# Altium schematic symbol library LATTICEPLDS_Library.SchLib: 291 symbols (part 12 of 32) (continued)
## LFE3-17EA-MG328
designator U?
SWAP_INFO: (S1+S2+S3+S4+S5+S6+S7+S8+S9+S10); SPLIT_INST: TRUE
part A pins: A3 PT4A||VREF1_0 TDQ7 (io), A4 PT7A TDQS7_P (io), A5 PT10A TDQ7 (io), A6 PT20A TDQ25 (io), A7 PT20B TDQ25 (io), A8 PT25A TDQS25_P (io), A9 PT25B TDQS25_N (io), B3 PT4B||VREF2_0 TDQ7 (io), B4 PT7B TDQS7_N (io), B5 PT10B TDQ7 (io), B6 PT13B TDQ16 (io), B7 PT22B TDQ25 (io), B8 PT23B TDQ25 (io), B9 PT28A||PCLKT0_0 TDQ25 (io), B10 PT28B||PCLKC0_0 TDQ25 (io), C6 PT13A TDQ16 (io), C7 PT22A TDQ25 (io), C8 PT23A TDQ25 (io), C9 PT26A TDQ25 (io), C10 PT26B TDQ25 (io), E7 VCCIO0 (power), E9 VCCIO0 (power), F8 VCCIO0 (power)
part B pins: A11 PT35A TDQ34 (io), A12 PT35B TDQ34 (io), A13 PT46A||VREF1_1 TDQ43 (io), A14 PT46B||VREF2_1 TDQ43 (io), B11 PT31A||PCLKT1_0 TDQ34 (io), B12 PT38A TDQ43 (io), B13 PT43A TDQS43_P (io), C11 PT31B||PCLKC1_0 TDQ34 (io), C12 PT38B TDQ43 (io), C13 PT43B TDQS43_N (io), E11 VCCIO1 (power), E13 VCCIO1 (power), F12 VCCIO1 (power)
part C pins: H14 VTT2 (power), J13 VCCIO2 (power), K14 VCCIO2 (power), K17 RUM0_VCCPLL (power), K18 PR18A||VREF1_2 RDQ23 (io), L18 PR20A*||RUM0_GDLLT_IN_A RDQ23 (io), L19 PR18B||VREF2_2 RDQ23 (io), M17 PR20B*||RUM0_GDLLT_IN_B RDQ23 (io), M18 PR26A*||PCLKT2_0 RDQ23 (io), M19 PR24B RDQ23 (io), N17 PR26B*||PCLKC2_0 RDQ23 (io), N18 PR26E_C||RUM0_GPLLT_IN_A (in), N19 PR26E_D||RUM0_GPLLT_IN_B (in)
part D pins: L14 VTT3 (power), M13 VTT3 (power), M14 VCCIO3 (power), N13 VCCIO3 (power), P14 VCCIO3 (power), P17 PR29A*||PCLKT3_0 RDQ32 (io), P19 PR29B*||PCLKC3_0 RDQ32 (io), R17 PR32B RDQS32_N (io), R18 PR32A RDQS32_P (io), R19 PR41A RDQS41_P (io), T17 PR35A*||VREF1_3 RDQ32 (io), T18 PR35B*||VREF2_3 RDQ32 (io), T19 PR41B RDQS41_N (io), U18 PR44A* RDQ41 (io), U19 PR44B* RDQ41 (io), V18 PR53A* RDQ50 (io), V19 PR53B* RDQ50 (io)
part E pins: K6 VCCIO6 (power), L6 VTT6 (power), L7 VCCIO6 (power), M7 VTT6 (power), N6 VCCIO6 (power), P6 VTT6 (power), R1 PL35A*||VREF1_6 LDQ32 (io), R2 PL29A*||PCLKT6_0 LDQ32 (io), R3 PL29B*||PCLKC6_0 LDQ32 (io), T1 PL35B*||VREF2_6 LDQ32 (io), T2 PL32B LDQS32_N (io), T3 PL32A LDQS32_P (io), U1 PL47A* LDQ50 (io), U2 PL33B LDQ32 (io), V1 PL53A* LDQ50 (io), V2 PL47B* LDQ50 (io), W2 PL53B* LDQ50 (io)
part F pins: C2 PL6A (io), D1 PL6B (io), D2 PL9B LDQ14 (io), D3 PL11A* LDQ14 (io), E1 PL9A LDQ14 (io), E2 PL12A* LDQ14 (io), E3 PL11B* LDQ14 (io), E6 VCCIO7 (power), F1 PL14A LDQS14_P (io), F3 PL12B* LDQ14 (io), G1 PL14B LDQS14_N (io), G2 PL15A LDQ14 (io), G3 PL15B LDQ14 (io), G7 VCCIO7 (power), H1 PL17A*||VREF1_7 LDQ14 (io), H2 PL17B*||VREF2_7 LDQ14 (io), H3 PL18A LDQ23 (io), H7 VTT7 (power), J1 PL20B*||LUM0_GDLLT_IN_B LDQ23 (io), J2 PL18B LDQ23 (io), J3 PL20A*||LUM0_GDLLT_IN_A LDQ23 (io), J6 VCCIO7 (power), K2 PL21A*||LUM0_GDLLT_FB_A LDQ23 (io), K3 LUM0_VCCPLL (power), L1 PL23B LDQS23_N (io), L2 PL21B*||LUM0_GDLLT_FB_B LDQ23 (io), L3 PL23A LDQS23_P (io), M1 PL24B LDQ23 (io), M2 PL24A LDQ23 (io), M3 PL26A*||PCLKT7_0 LDQ23 (io), N1 PL26E_A||LUM0_GPLLT_FB_A (in), N2 PL26E_C||LUM0_GPLLT_IN_A (in), N3 PL26B*||PCLKC7_0 LDQ23 (io), P1 PL26E_B||LUM0_GPLLT_FB_B (in), P3 PL26E_D||LUM0_GPLLT_IN_B (in)
part G pins: A2 TMS (in), A15 PT52B (io), A16 PT55A (io), A17 PT55B (io), A18 CFG2 (in), B1 TDO (out), B2 TCK (in), B14 PT52A (io), B15 PT50B (io), B16 PT53A (io), B17 PT53B (io), B18 CFG0 (in), B19 CFG1 (in), C1 TDI (in), C14 PT50A (io), C18 INITN (io), C19 PROGRAMN (in), D4 VCCJ (power), D17 PR6B||DI/CSSPI0N/CSSPIN (io), D18 PR6A (io), D19 CCLK (io), E17 PR8A||CS1N/HOLDN/CONT2N (io), E18 PR8B||CSN/SN/CONT1N (io), E19 DONE (io), F14 VCCIO8 (power), F17 PR11A||WRITEN (io), F19 PR9A||DOUT/CSON/CSSPI1N (io), G13 VCCIO8 (power), G17 PR14A||D3/SI (io), G18 PR11B||D0/SPIFASTN (io), G19 PR9B||MCLK (io), H17 PR14B||D4/SO (io), H18 PR12B||D2 (io), H19 PR12A||D1 (io), J17 PR15A||D5 (io), J18 PR15B||D6/SPID1 (io), J19 PR17A||D7/SPID0 (io), L17 PR17B||BUSY/SISPI (io), W18 XRES (in)
part H pins: T10 PCSA_REFCLKN (in), U10 PCSA_REFCLKP (in), V6 PCSA_VCCIB3 (power), V7 PCSA_VCCOB3 (power), V8 PCSA_VCCOB2 (power), V9 PCSA_VCCIB2 (power), V12 PCSA_VCCIB1 (power), V13 PCSA_VCCOB1 (power), V14 PCSA_VCCOB0 (power), V15 PCSA_VCCIB0 (power), W5 PCSA_HDINP3 (in), W6 PCSA_HDINN3 (in), W8 PCSA_HDOUTP3 (out), W9 PCSA_HDOUTN3 (out), W11 PCSA_HDOUTN0 (out), W12 PCSA_HDOUTP0 (out), W14 PCSA_HDINN0 (in), W15 PCSA_HDINP0 (in)
part I pins: A1 GND (power), A10 GND (power), A19 GND (power), C3 GND (power), C4 GND (power), C16 GND (power), C17 GND (power), D16 GND (power), E4 GND (power), E10 GND (power), E12 GND (power), E16 GND (power), F2 GND (power), F4 GND (power), F6 GND (power), F9 GND (power), F11 GND (power), F13 GND (power), F16 GND (power), F18 GND (power), G4 GND (power), G8 GND (power), G9 GND (power), G11 GND (power), G12 GND (power), G16 GND (power), H4 GND (power), H6 GND (power), H8 GND (power), H10 GND (power), H12 GND (power), H13 GND (power), H16 GND (power), J4 GND (power), J7 GND (power), J9 GND (power), J11 GND (power), J16 GND (power), K1 GND (power), K4 GND (power), K8 GND (power), K10 GND (power), K12 GND (power), K13 GND (power), K16 GND (power), K19 GND (power), L4 GND (power), L8 GND (power), L9 GND (power), L11 GND (power), L12 GND (power), L13 GND (power), L16 GND (power), M4 GND (power), M8 GND (power), M9 GND (power), M10 GND (power), M11 GND (power), M12 GND (power), M16 GND (power), N4 GND (power), N7 GND (power), N8 GND (power), N12 GND (power), N16 GND (power), P2 GND (power), P4 GND (power), P7 GND (power), P8 GND (power), P12 GND (power), P13 GND (power), P16 GND (power), P18 GND (power), R4 GND (power), R6 GND (power), R7 GND (power), R8 GND (power), R9 GND (power), R10 GND (power), R11 GND (power), R12 GND (power), R13 GND (power), R14 GND (power), R16 GND (power), T4 GND (power), T5 GND (power), T6 GND (power), T7 GND (power), T8 GND (power), T9 GND (power), T11 GND (power), T12 GND (power), T13 GND (power), T14 GND (power), T15 GND (power), T16 GND (power), U3 GND (power), U4 GND (power), U5 GND (power), U6 GND (power), U7 GND (power), U8 GND (power), U9 GND (power), U11 GND (power), U12 GND (power), U13 GND (power), U14 GND (power), U15 GND (power), U16 GND (power), U17 GND (power), V3 GND (power), V4 GND (power), V5 GND (power), V10 GND (power), V11 GND (power), V16 GND (power), V17 GND (power), W1 GND (power), W3 GND (power), W4 GND (power), W7 GND (power), W10 GND (power), W13 GND (power), W16 GND (power), W17 GND (power), W19 GND (power)
part J pins: C5 VCCAUX (power), C15 VCCAUX (power), E8 VCC (power), E14 VCC (power), F7 VCC (power), F10 VCCAUX (power), G6 VCC (power), G10 VCC (power), G14 VCC (power), H9 VCC (power), H11 VCC (power), J8 VCC (power), J10 VCC (power), J12 VCC (power), J14 VCCAUX (power), K7 VCCAUX (power), K9 VCC (power), K11 VCC (power), L10 VCC (power), M6 VCC (power), N9 VCCA (power), N10 VCCA (power), N11 VCCA (power), N14 VCC (power), P9 VCCA (power), P10 VCCA (power), P11 VCCA (power)
part C text: *=TrueLVDS
part D text: *=TrueLVDS
part E text: *=TrueLVDS
part F text: *=TrueLVDS

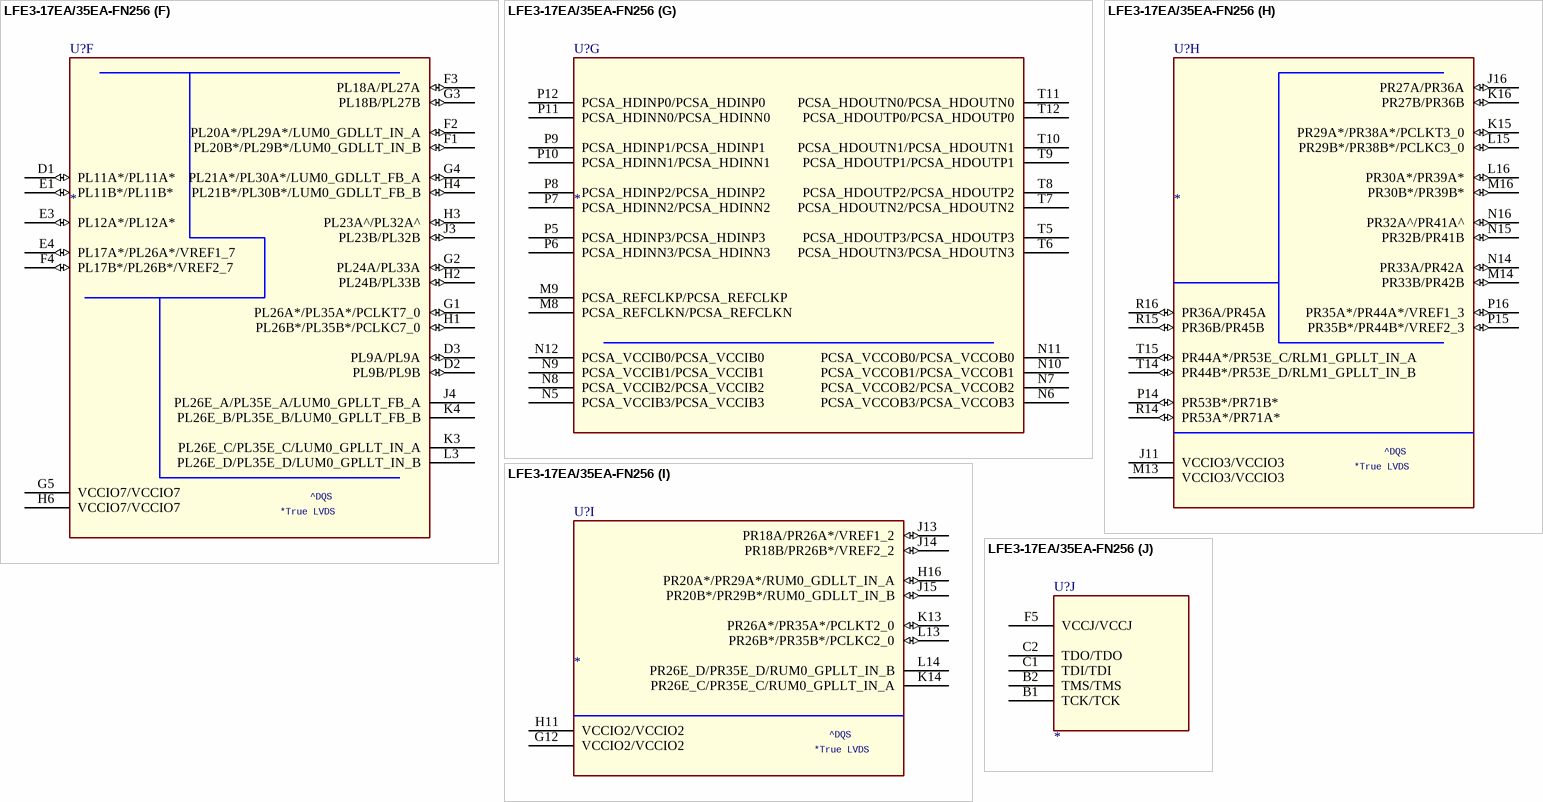
[diagram p127: symbol LFE3-17EA/35EA-FN256]

## LFE3-17EA/35EA-FN256
designator U?
SPLIT_INST: TRUE; SWAP_INFO: (S1+S2+S3+S4+S5+S6+S7+S8+S9+S10)
part A pins: J1 PL27A/PL36A (io), J6 VCCIO6/VCCIO6 (power), K1 PL29A*/PL38A*/PCLKT6_0 (io), K2 PL27B/PL36B (io), L1 PL29B*/PL38B*/PCLKC6_0 (io), L2 PL30A*/PL39A* (io), L4 PL32A^/PL41A^ (io), L5 PL32B/PL41B (io), M1 PL33A/PL42A (io), M2 PL30B*/PL39B* (io), M3 PL35A*/PL44A*/VREF1_6 (io), M4 VCCIO6/VCCIO6 (power), N1 PL33B/PL42B (io), N3 PL35B*/PL44B*/VREF2_6 (io), P1 PL36A/PL45A (io), P2 PL44A*/PL53E_C/LLM1_GPLLT_IN_A (io), P3 PL44B*/PL53E_D/LLM1_GPLLT_IN_B (io), R1 PL36B/PL45B (io), R2 PL53A*/PL71A* (io), R3 PL53B*/PL71B* (io), T2 PL51A/PL69A (io), T3 PL51B/PL69B (io)
part B pins: A2 PT5A/PT5A (io), A3 PT5B/PT5B (io), A4 PT8A/PT8A (io), A5 PT8B/PT8B (io), A6 PT22B/PT31B (io), A7 PT23B/PT32B (io), A8 PT26A/PT35A (io), A9 PT26B/PT35B (io), B3 PT4B/PT4B/VREF2_0 (io), B5 PT10B/PT10B (io), B6 PT22A/PT31A (io), B7 PT23A/PT32A (io), C3 PT4A/PT4A/VREF1_0 (io), C4 PT2B/PT2B (io), C5 PT10A/PT10A (io), C6 PT20A/PT29A (io), C7 PT20B/PT29B (io), D4 PT2A/PT2A (io), D5 PT7A^/PT7A^ (io), D6 PT19B/PT28B (io), D7 PT25A^/PT34A^ (io), D8 PT25B/PT34B (io), E5 PT7B/PT7B (io), E6 PT19A/PT28A (io), E7 VCCIO0/VCCIO0 (power), E8 PT28A/PT37A/PCLKT0_0 (io), E9 PT28B/PT37B/PCLKC0_0 (io), F7 VCCIO0/VCCIO0 (power)
part C pins: A1 GND/GND (power), A16 GND/GND (power), B4 GND/GND (power), B8 GND/GND (power), B12 GND/GND (power), D15 GND/GND (power), E2 GND/GND (power), F6 GND/GND (power), F8 VCCAUX/VCCAUX (power), F10 GND/GND (power), F11 GND/GND (power), G6 VTT7/VTT7 (power), G7 GND/GND (power), G8 VCC/VCC (power), G9 GND/GND (power), G10 VCC/VCC (power), G11 VTT2/VTT2 (power), H5 VCCAUX/VCCAUX (power), H7 VCC/VCC (power), H8 GND/GND (power), H9 GND/GND (power), H10 GND/GND (power), H12 VCCAUX/VCCAUX (power), H15 GND/GND (power), J2 GND/GND (power), J5 GND/GND (power), J7 GND/GND (power), J8 GND/GND (power), J9 GND/GND (power), J10 VCC/VCC (power), J12 GND/GND (power), K5 VCCPLL_L/VCCPLL_L (power), K6 VTT6/VTT6 (power), K7 VCC/VCC (power), K8 GND/GND (power), K9 VCC/VCC (power), K10 GND/GND (power), K11 VTT3/VTT3 (power), K12 VCCPLL_R/VCCPLL_R (power), L6 GND/GND (power), L7 GND/GND (power), L8 VCCA/VCCA (power), L9 VCCA/VCCA (power), L10 VCCAUX/VCCAUX (power), L11 XRES/XRES (in), L12 GND/GND (power), M5 GND/GND (power), M6 GND/GND (power), M7 VCCA/VCCA (power), M10 VCCA/VCCA (power), M11 GND/GND (power), M12 GND/GND (power), M15 GND/GND (power), N2 GND/GND (power), N4 GND/GND (power), N13 GND/GND (power), P4 GND/GND (power), P13 GND/GND (power), R4 GND/GND (power), R5 GND/GND (power), R6 GND/GND (power), R7 GND/GND (power), R8 GND/GND (power), R9 GND/GND (power), R10 GND/GND (power), R11 GND/GND (power), R12 GND/GND (power), R13 GND/GND (power), T1 GND/GND (power), T4 GND/GND (power), T13 GND/GND (power), T16 GND/GND (power)
part D pins: A12 PT50A/PT68A/XD8 (io), A13 PT50B/PT68B/XD9 (io), A14 PT53A/PT71A/XD12 (io), A15 PT53B/PT71B/XD13 (io), B13 PT55A/PT73A/XD14 (io), B14 PT55B/PT73B/XD15 (io), B15 CFG1/CFG1 (in), B16 CFG0/CFG0 (in), C12 PT52A/PT70A/XD10 (io), C13 PT52B/PT70B/XD11 (io), C14 CFG2/CFG2 (in), C15 PROGRAMN/PROGRAMN (in), C16 PR6A/PR6A/HFP (io), D13 CCLK/CCLK (io), D14 INITN/INITN (io), D16 PR6B/PR6B/DI/CSSPI0N/CEN/CSSPIN (io), E12 DONE/DONE (io), E13 PR8A/PR8A/CS1N/HOLDN/CONT2N/RDY (io), E14 PR11A/PR11A/WRITEN (io), E15 PR9B/PR9B/MCLK (io), E16 PR9A/PR9A/DOUT/CSON/CSSPI1N (io), F12 VCCIO8/VCCIO8 (power), F13 PR8B/PR8B/CSN/SN/CONT1N/OEN (io), F14 PR11B/PR11B/D0/SPIFASTN (io), F15 PR12B/PR12B/D2 (io), F16 PR12A/PR12A/D1 (io), G13 PR14B/PR14B/D4/SO (io), G14 PR14A/PR14A/D3/SI (io), G15 PR15B/PR15B/D6/SPID1 (io), G16 PR15A/PR15A/D5 (io), H13 PR17A/PR17A/D7/SPID0 (io), H14 PR17B/PR17B/BUSY/SISPI/AVDN (io)
part E pins: A10 PT35A/PT44A (io), A11 PT35B/PT44B (io), B9 PT29B/PT38B (io), B10 PT34B/PT43B (io), B11 PT37B/PT46B (io), C8 PT29A/PT38A (io), C9 PT31B/PT40B/PCLKC1_0 (io), C10 PT34A^/PT43A^ (io), C11 PT37A/PT46A (io), D9 PT31A/PT40A/PCLKT1_0 (io), D10 PT32A/PT41A (io), D11 PT46A/PT64A/VREF1_1 (io), D12 PT46B/PT64B/VREF2_1 (io), E10 VCCIO1/VCCIO1 (power), E11 PT32B/PT41B (io), F9 VCCIO1/VCCIO1 (power)
part F pins: D1 PL11A*/PL11A* (io), D2 PL9B/PL9B (io), D3 PL9A/PL9A (io), E1 PL11B*/PL11B* (io), E3 PL12A*/PL12A* (io), E4 PL17A*/PL26A*/VREF1_7 (io), F1 PL20B*/PL29B*/LUM0_GDLLT_IN_B (io), F2 PL20A*/PL29A*/LUM0_GDLLT_IN_A (io), F3 PL18A/PL27A (io), F4 PL17B*/PL26B*/VREF2_7 (io), G1 PL26A*/PL35A*/PCLKT7_0 (io), G2 PL24A/PL33A (io), G3 PL18B/PL27B (io), G4 PL21A*/PL30A*/LUM0_GDLLT_FB_A (io), G5 VCCIO7/VCCIO7 (power), H1 PL26B*/PL35B*/PCLKC7_0 (io), H2 PL24B/PL33B (io), H3 PL23A^/PL32A^ (io), H4 PL21B*/PL30B*/LUM0_GDLLT_FB_B (io), H6 VCCIO7/VCCIO7 (power), J3 PL23B/PL32B (io), J4 PL26E_A/PL35E_A/LUM0_GPLLT_FB_A, K3 PL26E_C/PL35E_C/LUM0_GPLLT_IN_A, K4 PL26E_B/PL35E_B/LUM0_GPLLT_FB_B, L3 PL26E_D/PL35E_D/LUM0_GPLLT_IN_B
part G pins: M8 PCSA_REFCLKN/PCSA_REFCLKN, M9 PCSA_REFCLKP/PCSA_REFCLKP, N5 PCSA_VCCIB3/PCSA_VCCIB3 (power), N6 PCSA_VCCOB3/PCSA_VCCOB3 (power), N7 PCSA_VCCOB2/PCSA_VCCOB2 (power), N8 PCSA_VCCIB2/PCSA_VCCIB2 (power), N9 PCSA_VCCIB1/PCSA_VCCIB1 (power), N10 PCSA_VCCOB1/PCSA_VCCOB1 (power), N11 PCSA_VCCOB0/PCSA_VCCOB0 (power), N12 PCSA_VCCIB0/PCSA_VCCIB0 (power), P5 PCSA_HDINP3/PCSA_HDINP3, P6 PCSA_HDINN3/PCSA_HDINN3, P7 PCSA_HDINN2/PCSA_HDINN2, P8 PCSA_HDINP2/PCSA_HDINP2, P9 PCSA_HDINP1/PCSA_HDINP1, P10 PCSA_HDINN1/PCSA_HDINN1, P11 PCSA_HDINN0/PCSA_HDINN0, P12 PCSA_HDINP0/PCSA_HDINP0, T5 PCSA_HDOUTP3/PCSA_HDOUTP3, T6 PCSA_HDOUTN3/PCSA_HDOUTN3, T7 PCSA_HDOUTN2/PCSA_HDOUTN2, T8 PCSA_HDOUTP2/PCSA_HDOUTP2, T9 PCSA_HDOUTP1/PCSA_HDOUTP1, T10 PCSA_HDOUTN1/PCSA_HDOUTN1, T11 PCSA_HDOUTN0/PCSA_HDOUTN0, T12 PCSA_HDOUTP0/PCSA_HDOUTP0
part H pins: J11 VCCIO3/VCCIO3 (power), J16 PR27A/PR36A (io), K15 PR29A*/PR38A*/PCLKT3_0 (io), K16 PR27B/PR36B (io), L15 PR29B*/PR38B*/PCLKC3_0 (io), L16 PR30A*/PR39A* (io), M13 VCCIO3/VCCIO3 (power), M14 PR33B/PR42B (io), M16 PR30B*/PR39B* (io), N14 PR33A/PR42A (io), N15 PR32B/PR41B (io), N16 PR32A^/PR41A^ (io), P14 PR53B*/PR71B* (io), P15 PR35B*/PR44B*/VREF2_3 (io), P16 PR35A*/PR44A*/VREF1_3 (io), R14 PR53A*/PR71A* (io), R15 PR36B/PR45B (io), R16 PR36A/PR45A (io), T14 PR44B*/PR53E_D/RLM1_GPLLT_IN_B (io), T15 PR44A*/PR53E_C/RLM1_GPLLT_IN_A (io)
part I pins: G12 VCCIO2/VCCIO2 (power), H11 VCCIO2/VCCIO2 (power), H16 PR20A*/PR29A*/RUM0_GDLLT_IN_A (io), J13 PR18A/PR26A*/VREF1_2 (io), J14 PR18B/PR26B*/VREF2_2 (io), J15 PR20B*/PR29B*/RUM0_GDLLT_IN_B (io), K13 PR26A*/PR35A*/PCLKT2_0 (io), K14 PR26E_C/PR35E_C/RUM0_GPLLT_IN_A, L13 PR26B*/PR35B*/PCLKC2_0 (io), L14 PR26E_D/PR35E_D/RUM0_GPLLT_IN_B
part J pins: B1 TCK/TCK, B2 TMS/TMS, C1 TDI/TDI, C2 TDO/TDO, F5 VCCJ/VCCJ (power)

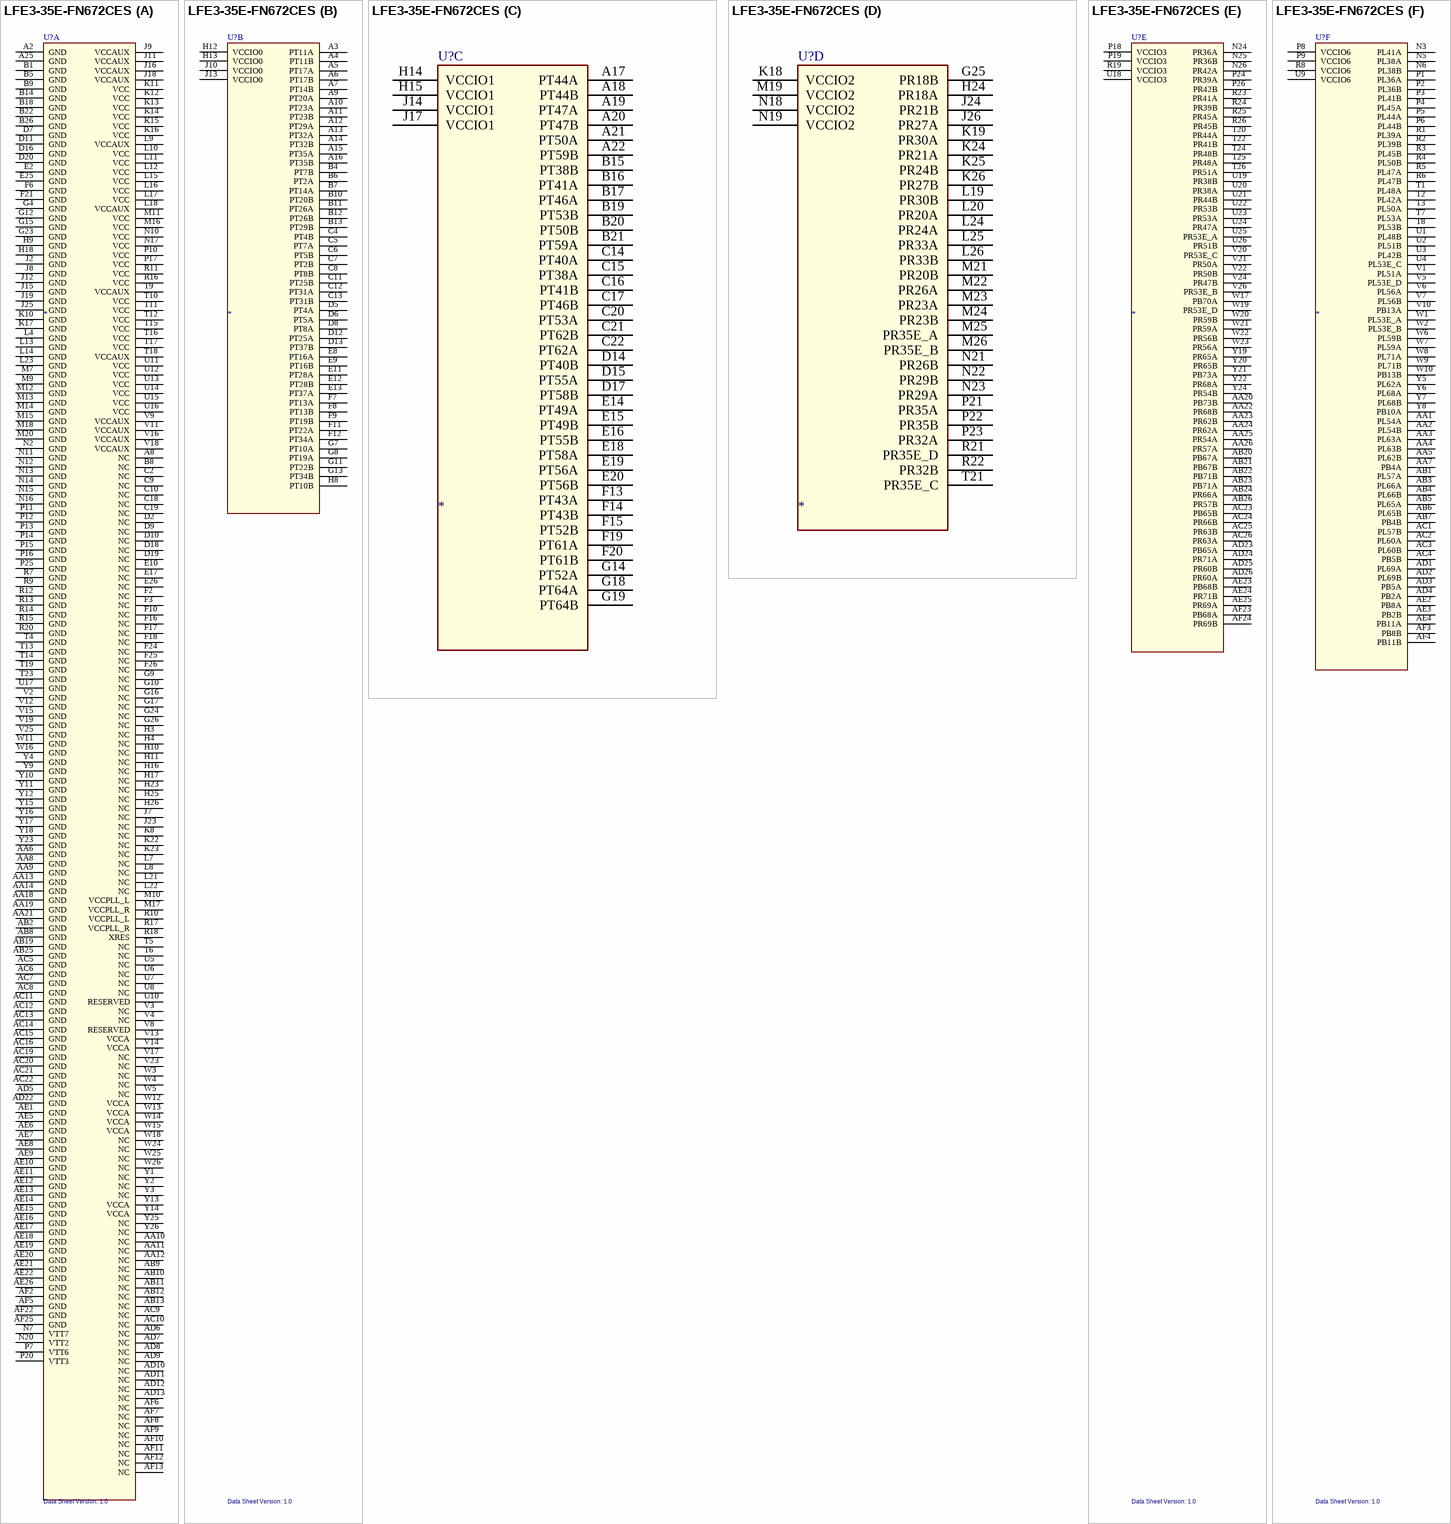
[diagram p128: symbol LFE3-35E-FN672CES]
